# Altium footprint library Connectors SMD.PcbLib: 130 footprints (part 4 of 12) (continued)
## MOLEX_78171-0004 [mm] "1.20mm Pitch Pico-EZmate Wire-to-Board Header, Vertical, Housing Height: 1.55mm, with Side-Friction Locks, 4 Circuits"
height 1.55
pads (6):
  rect 0.6x0.85 smd: 1(-1.8,-0.01) 2(-0.6,-0.01) 3(0.6,-0.01) 4(1.8,-0.01)
  rect 0.7x0.8 smd: 5(2.89,-3.788) 6(-2.95,-3.788)
Top Overlay:
  circle w0.25: c-1.8,1.075 r0.125
  lines w0.2: -3.3,-2.99 -3.3,0.16 -2.5,0.16 ; -2.85,-2.99 -2.85,-2.69 -2.6,-2.69 -2.6,-2.19 -2.85,-2.19 -2.85,-1.67 -2.49,-1.67 -2.49,-1.24 -2.84,-1.24 -2.84,-0.64 -2.5,-0.64 ; -2.2,-4.34 -1.95,-4.34 -1.41,-3.66 1.41,-3.66 1.95,-4.34 2.14,-4.34 ; -2.1,-4.34 -2.1,-1.47 2.1,-1.47 2.1,-4.34 ; 2.5,-0.64 2.84,-0.64 2.84,-1.24 2.49,-1.24 2.49,-1.67 2.85,-1.67 2.85,-2.19 2.6,-2.19 2.6,-2.69 2.85,-2.69 2.85,-2.99 ; 2.5,0.16 3.3,0.16 3.3,-2.99
Mechanical 7:
  lines w0.1: -2.85,-1.67 -2.49,-1.67
Mechanical 8:
  lines w0.1: -0.5,0 0,0 ; 0,-0.5 0,0 ; 0,0.5 0,0 ; 0.5,0 0,0 ; -3.3,-4.185 -2.6,-4.185 ; -3.3,-4.185 -3.3,-3.39 -2.6,-3.39 -2.6,-4.185 ; -3.3,-4.185 -2.95,-3.788 -2.6,-4.185 ; -2.1,-0.435 -1.8,-0.01 -1.5,-0.435 ; -2.1,-0.435 -2.1,0.415 -1.5,0.415 -1.5,-0.435 ; -2.1,-0.435 -1.5,-0.435 ; -0.9,-0.435 -0.6,-0.01 -0.3,-0.435 ; -0.9,-0.435 -0.9,0.415 -0.3,0.415 -0.3,-0.435 ; -0.9,-0.435 -0.3,-0.435 ; 0.3,-0.435 0.6,-0.01 0.9,-0.435 ; 0.3,-0.435 0.3,0.415 0.9,0.415 0.9,-0.435 ; 0.3,-0.435 0.9,-0.435 ; 1.5,-0.435 1.8,-0.01 2.1,-0.435 ; 1.5,-0.435 1.5,0.415 2.1,0.415 2.1,-0.435 ; 1.5,-0.435 2.1,-0.435 ; 2.54,-4.185 3.24,-4.185 ; 2.54,-4.185 2.54,-3.39 3.24,-3.39 3.24,-4.185 ; 2.54,-4.185 2.89,-3.788 3.24,-4.185
Mechanical 14:
  lines w0.1: -3.3,-3.44 -2.6,-3.44 ; -3.3,-3.34 -2.5,-3.34 -2.6,-3.44 ; -3.07,-3.24 -3.07,-1.67 ; -2.89,-3.24 -2.89,-1.67 ; -2.85,-3.24 -2.85,-2.69 -2.6,-2.69 -2.6,-2.19 -2.85,-2.19 -2.85,-1.67 ; -2.69,-1.67 -2.69,-1.44 ; -2.6,-4.34 -2.6,-3.44 ; -2.5,-4.34 -2.5,-3.24 -3.1,-3.24 -3.1,-1.67 -2.49,-1.67 -2.49,-1.24 ; -2.1,-4.34 -2.1,-1.47 2.1,-1.47 2.1,-4.34 ; 2.5,-4.34 2.5,-3.24 3.1,-3.24 3.1,-1.67 2.49,-1.67 2.49,-1.24 ; 2.6,-4.34 2.6,-3.44 ; 2.69,-1.67 2.69,-1.44 ; 2.85,-3.24 2.85,-1.67 ; 2.85,-2.69 2.6,-2.69 2.6,-2.19 2.85,-2.19 ; 2.89,-3.24 2.89,-1.67 ; 3.3,-3.44 2.6,-3.44 ; 3.3,-3.34 2.5,-3.34 2.6,-3.44 ; -3.04,-1.44 -3.04,-0.44 ; -3.04,-1.44 -2.84,-1.24 ; -3.04,-1.44 -2.69,-1.44 ; -3.04,-0.44 -2.84,-0.64 ; -3.04,-0.44 3.04,-0.44 ; -2.84,-1.24 -2.49,-1.24 ; -2.84,-1.24 -2.84,-0.64 ; -2.84,-0.64 2.84,-0.64 ; -2.69,-1.44 -2.49,-1.24 ; 2.49,-1.24 2.69,-1.44 ; 2.49,-1.24 2.84,-1.24 ; 2.69,-1.44 3.04,-1.44 ; 2.84,-1.24 3.04,-1.44 ; 2.84,-1.24 2.84,-0.64 ; 2.84,-0.64 3.04,-0.44 ; 3.04,-1.44 3.04,-0.44 ; -3.3,-4.34 -3.3,0.16 3.3,0.16 3.3,-4.34 1.95,-4.34 1.41,-3.66 -1.41,-3.66 -1.95,-4.34 -3.3,-4.34 ; -3.02,-4.17 -2.82,-4.17 -2.82,-3.5 -3.02,-3.5 -3.02,-4.17 ; 2.82,-4.17 2.82,-3.5 3.02,-3.5 3.02,-4.17 2.82,-4.17
Mechanical 15:
  lines w0.05: -3.55,-4.59 3.55,-4.59 3.55,0.665 -3.55,0.665 -3.55,-4.59
3D body: height 1.45, standoff 0, extent -3.3,-4.34 3.3,0.19

## MOLEX_87703-0001 [mm] "1.27mm Pitch Serial ATA Device Plug, 63.50mm Drive, Without Jumper, 22 Circuits"
height 4
pads (26):
  rect 3.66x4.4 smd: 1(-24.15,-4.8) 2(24.15,-4.8)
  round 1 hole 1.3 unplated mask+0.15: MTG1(-18.865,0) MTG2(18.865,0)
  rect 0.9x2.1 smd: P1(1.905,0) P2(0.635,0) P3(-0.635,0) P4(-1.905,0) P5(-3.175,0) P6(-4.445,0) P7(-5.715,0) P8(-6.985,0) P9(-8.255,0) P10(-9.525,0) P11(-10.795,0) P12(-12.065,0) P13(-13.335,0) P14(-14.605,0) P15(-15.875,0) S1(15.875,0) S2(14.605,0) S3(13.335,0) S4(12.065,0) S5(10.795,0) S6(9.525,0) S7(8.255,0)
Top Overlay:
  drawing of 164 lines, arcs and shapes, not listed
  text "S1" at 15.325,1.57 h1
  text "P1" at 1.38,1.62 h1
Keep-Out Layer:
  board cut-out: -21.765,-7.55 -21.774,-2.6 -21.739,-2.339 -21.639,-2.096 -21.478,-1.887 -21.269,-1.727 -21.026,-1.626 -20.765,-1.591 -20.765,-1.6 20.765,-1.591 21.026,-1.626 21.269,-1.727 21.478,-1.887 21.639,-2.096 21.739,-2.339 21.774,-2.6 21.765,-2.6 21.765,-7.55
Mechanical 1:
  lines w0.635: -21.765,-7.55 -21.765,-2.6 cw(c-20.765,-2.6) -20.765,-1.6 0,-1.6 20.765,-1.6 cw(c20.765,-2.6) 21.765,-2.6 21.765,-7.55
Mechanical 8:
  drawing of 215 lines, arcs and shapes, not listed
Mechanical 13:
  lines w0.254: 2.875,-2.65 2.875,-2.09
Mechanical 14:
  drawing of 190 lines, arcs and shapes, not listed
  text "S1" at 15.325,1.57 h1
  text "P1" at 1.38,1.62 h1
Mechanical 15:
  lines w0.05: -26.23,-7.8 -26.23,1.3 26.23,1.3 26.23,-7.8 -26.23,-7.8
3D body: height 3.4, standoff -0.6, extent -25.465,-7.55 25.465,0.95

## MOLEX_87832-1420 [mm] "Milli-Grid, Pitch 2mm, 14 contacts, Surface Mount Vertical Header With Locking Window And Centre Polarization Slot"
height 6.4
pads (16):
  rect 1x2.75 smd: 1(-6,-2.125) 2(-6,2.125) 3(-4,-2.125) 4(-4,2.125) 5(-2,-2.125) 6(-2,2.125) 7(0,-2.125) 8(0,2.125) 9(2,-2.125) 10(2,2.125) 11(4,-2.125) 12(4,2.125) 13(6,-2.125) 14(6,2.125)
  round 0.5 hole 1 unplated: 15(-5,0) 16(5,0)
Top Overlay:
  lines w0.2: -8.325,-1.5 -7.675,-1.5 ; -8.325,0.5 -7.675,0.5 ; -6.8,-3.15 -8.325,-3.15 ; -6.8,-2.5 -7.675,-2.5 ; -6.8,2.5 -7.675,2.5 ; -6.8,3.15 -8.325,3.15 ; 6.8,-3.15 8.325,-3.15 ; 6.8,-2.5 7.675,-2.5 ; 6.8,2.5 7.675,2.5 ; 6.8,3.15 8.325,3.15 ; 7.675,-0.5 8.325,-0.5 ; 7.675,1.5 8.325,1.5 ; -8.325,-3.15 -7.675,-2.5 ; -8.325,-3.15 -8.325,3.15 ; -8.325,3.15 -7.675,2.5 ; -7.675,-2.5 -7.675,2.5 ; 7.675,-2.5 7.675,2.5 ; 7.675,-2.5 8.325,-3.15 ; 7.675,-2.5 8.325,-3.15 ; 7.675,2.5 8.325,3.15 ; 7.675,2.5 8.325,3.15 ; 8.325,-3.15 8.325,3.15 ; -6.5,-4.25 -5.5,-4.25 -6,-3.75 -6.5,-4.25
Mechanical 14:
  lines w0.1: -8.325,-1.5 -7.675,-1.5 ; -8.325,0.5 -7.675,0.5 ; 7.675,-0.5 8.325,-0.5 ; 7.675,1.5 8.325,1.5 ; -8.325,-3.15 -8.325,3.15 ; -8.325,-3.15 -7.675,-2.5 ; -8.325,-3.15 8.325,-3.15 ; -8.325,3.15 -7.675,2.5 ; -8.325,3.15 8.325,3.15 ; -7.675,-2.5 7.675,-2.5 ; -7.675,-2.5 -7.675,2.5 ; -7.675,2.5 7.675,2.5 ; 7.675,-2.5 8.325,-3.15 ; 7.675,-2.5 8.325,-3.15 ; 7.675,-2.5 7.675,2.5 ; 7.675,2.5 8.325,3.15 ; 7.675,2.5 8.325,3.15 ; 8.325,-3.15 8.325,3.15 ; -6.5,-4.25 -6,-3.75 -5.5,-4.25 -6.5,-4.25
Mechanical 15:
  lines w0.05: -8.575,-3.765 8.575,-3.765 8.575,3.765 -8.575,3.765 -8.575,-3.765
3D body: height 7.6, standoff -1, extent -8.325,-3.15 8.325,3.15

## MOLEX_91525-1210 [mm] "0.50mm (.020\") Pitch LaneLink I/O Latch Receptacle, 12 Lane, Cx4 Ethernet, 24 Circuits, 2 Screw Holes"
height 11
pads (77):
  rect 0.31x2.6 smd: G1(18,0) G2(16.5,0) G3(15,0) G4(13.5,0) G5(12,0) G6(10.5,0) G7(9,0) G8(7.5,0) G9(6,0) G10(4.5,0) G11(3,0) G12(1.5,0) G13(0,0) G14(-1.5,0) G15(-3,0) G16(-4.5,0) G17(-6,0) G18(-7.5,0) G19(-9,0) G20(-10.5,0) G21(-12,0) G22(-13.5,0) G23(-15,0) G24(-16.5,0) G25(-18,0) S1(17.5,-2.1) S2(17,-2.1) S3(16,-2.1) S4(15.5,-2.1) S5(14.5,-2.1) S6(14,-2.1) S7(13,-2.1) S8(12.5,-2.1) S9(11.5,-2.1) S10(11,-2.1) S11(10,-2.1) S12(9.5,-2.1) S13(8.5,-2.1) S14(8,-2.1) S15(7,-2.1) S16(6.5,-2.1) S17(5.5,-2.1) S18(5,-2.1) S19(4,-2.1) S20(3.5,-2.1) S21(2.5,-2.1) S22(2,-2.1) S23(1,-2.1) S24(0.5,-2.1) S25(-0.5,-2.1) S26(-1,-2.1) S27(-2,-2.1) S28(-2.5,-2.1) S29(-3.5,-2.1) S30(-4,-2.1) S31(-5,-2.1) S32(-5.5,-2.1) S33(-6.5,-2.1) S34(-7,-2.1) S35(-8,-2.1) S36(-8.5,-2.1) S37(-9.5,-2.1) S38(-10,-2.1) S39(-11,-2.1) S40(-11.5,-2.1) S41(-12.5,-2.1) S42(-13,-2.1) S43(-14,-2.1) S44(-14.5,-2.1) S45(-15.5,-2.1) S46(-16,-2.1) S47(-17,-2.1) S48(-17.5,-2.1)
  round 1 hole 1.82 unplated: MTG1(19.25,-4.1)
  oval 1.78x1 hole 1.82 slot 2.6 at 0 deg unplated: MTG2(-19.2,-4.1)
  round 3.65 hole 2.2: MTG3(22.5,-2.1) MTG4(-22.45,-2.1)
Top Overlay:
  circle w0.25: c18,2.3 r0.125
  lines w0.2: -24.245,-1 -24.245,0.9 -20.345,0.9 -20.345,-2.35 -19.245,-2.35 ; -23.395,-8.5 -23.395,-14.9 -22.195,-14.9 -22.195,-8.5 ; -23.395,-8.2 -23.395,-4.2 ; -20.56,-8.5 -20.56,-14.2 ccw(c-19.86,-14.2) -19.86,-14.9 19.87,-14.9 ccw(c19.87,-14.2) 20.57,-14.2 20.57,-8.5 ; 18.6,1.7 19.1,0 19.6,1.7 ; 19.255,-2.35 20.355,-2.35 20.355,0.9 24.255,0.9 24.255,-1 ; 22.205,-8.5 22.205,-14.9 23.405,-14.9 23.405,-8.5 ; 23.405,-8.2 23.405,-4.2 ; -24.495,-8.5 24.505,-8.5 24.505,-8.2 -24.495,-8.2 -24.495,-8.5
Mechanical 8:
  lines w0.1: -25,-8 25,-8
  text "PCB Edge" at -3.175,-7.525 h1.02
Mechanical 13:
  circle w0.1: c22.455,-2.1 r1.1
  circle w0.1: c-19.245,-4.1 r0.91
  circle w0.1: c-22.445,-2.1 r1.1
  lines w0.1: -23.545,-2.1 -22.445,-2.1 -22.445,-3.2 ; -19.245,-5.01 -19.245,-4.1 -18.335,-4.1 ; 17.955,-4.1 18.865,-4.1 18.865,-5.01 ; 19.255,-4.454 19.255,-4.1 19.554,-4.1 ; 20.555,-4.1 19.645,-4.1 19.645,-5.01 ; 22.455,-3.2 22.455,-2.1 23.555,-2.1 ; 18.865,-5.01 cw(c18.865,-4.1) 18.865,-3.19 19.645,-3.19 cw(c19.645,-4.1) 19.645,-5.01 ; 18.865,-5.01 19.645,-5.01
Mechanical 14:
  circle w0.25: c18,2.3 r0.125
  lines w0.1: -23.395,-8.5 -23.395,-14.9 -22.195,-14.9 -22.195,-8.5 ; -23.395,-8.2 -23.395,-3.71 -23.595,-3.51 -24.045,-3.51 -24.245,-3.31 -24.245,0.9 -20.345,0.9 -20.345,-2.35 -19.245,-2.35 ; -20.56,-8.5 -20.56,-14.2 ccw(c-19.86,-14.2) -19.86,-14.9 19.87,-14.9 ccw(c19.87,-14.2) 20.57,-14.2 20.57,-8.5 ; 19.255,-2.35 20.355,-2.35 20.355,0.9 24.255,0.9 24.255,-3.31 24.055,-3.51 23.605,-3.51 23.405,-3.71 23.405,-8.2 ; 22.205,-8.5 22.205,-14.9 23.405,-14.9 23.405,-8.5 ; -24.495,-8.5 24.505,-8.5 24.505,-8.2 -24.495,-8.2 -24.495,-8.5
  lines w0.2: 18.6,1.7 19.1,0 19.6,1.7
Mechanical 15:
  lines w0.05: -0.5,0 0.5,0 ; 0,-0.5 0,0.5 ; -25,-8 -25,1.7 25,1.7 25,-8 -25,-8
3D body: height 11.05, standoff -2.35, extent -24.458,-14.898 24.542,1.002

## MOLEX_500254-1927 [mm] "19 Contacts, Pitch 0.5mm, Right Angle, HDMI Receptacle"
height 6.18
pads (23):
  rect 0.28x2.6 smd: 1(4.5,0) 2(4,0) 3(3.5,0) 4(3,0) 5(2.5,0) 6(2,0) 7(1.5,0) 8(1,0) 9(0.5,0) 10(0,0) 11(-0.5,0) 12(-1,0) 13(-1.5,0) 14(-2,0) 15(-2.5,0) 16(-3,0) 17(-3.5,0) 18(-4,0) 19(-4.5,0)
  oval 1.5x2.7 hole 0.9 slot 2.1 at 90 deg: SHIELD(-7.25,-6.72) SHIELD(7.25,-6.72)
  oval 1.5x3.3 hole 0.9 slot 2.7 at 90 deg: SHIELD(-7.25,-0.76) SHIELD(7.25,-0.76)
Top Overlay:
  circle w0.25: c5.225,1.075 r0.125
  lines w0.2: -7.5,-8.34 -7.5,-11.31 7.5,-11.31 7.5,-8.34 ; -7.5,-5.1 -7.5,-2.68 ; -6.5,-11.31 -6.5,-8.055 ; -6.5,-5.385 -6.5,-2.395 ; -6.467,0.84 -5.8,0.84 -5.8,-1.66 ; -6.388,0.74 -5.8,0.74 ; -6.2,-1.66 -5.8,-1.66 ; -6.2,-0.16 -5.8,-0.16 ; -5.8,-0.26 -4.94,-0.26 ; -5.6,-0.26 -5.6,-0.71 -4.94,-0.71 ; -4.94,-0.76 -5.6,-0.76 -5.6,-1.46 cw(c-5.8,-1.46) -5.8,-1.66 ; 4.94,-0.76 5.6,-0.76 5.6,-1.46 ccw(c5.8,-1.46) 5.8,-1.66 ; 4.94,-0.71 5.6,-0.71 5.6,-0.26 ; 4.94,-0.26 5.8,-0.26 ; 5.8,-0.16 6.2,-0.16 ; 5.8,0.74 6.388,0.74 ; 5.8,1.09 6.467,1.09 ; 6.2,-1.66 5.8,-1.66 ; 6.467,0.84 5.8,0.84 5.8,-1.66 ; 6.5,-11.31 6.5,-8.055 ; 6.5,-5.385 6.5,-2.395 ; 7.5,-5.1 7.5,-2.68
Mechanical 8:
  lines w0.1: -8,-10.31 0,-10.31 8,-10.31 ; -7.75,-7.32 -7.25,-7.32 ; -7.75,-6.72 -7.25,-6.72 ; -7.75,-6.12 -7.25,-6.12 ; -7.75,-1.66 -7.25,-1.66 ; -7.75,-0.76 -7.25,-0.76 ; -7.75,0.14 -7.25,0.14 ; -7.25,-7.82 -7.25,-7.32 ; -7.25,-7.22 -7.25,-6.72 ; -7.25,-6.22 -7.25,-6.72 ; -7.25,-5.62 -7.25,-6.12 ; -7.25,-2.16 -7.25,-1.66 ; -7.25,-1.26 -7.25,-0.76 ; -7.25,-0.26 -7.25,-0.76 ; -7.25,0.64 -7.25,0.14 ; -6.75,-7.32 -7.25,-7.32 ; -6.75,-6.72 -7.25,-6.72 ; -6.75,-6.12 -7.25,-6.12 ; -6.75,-1.66 -7.25,-1.66 ; -6.75,-0.76 -7.25,-0.76 ; -6.75,0.14 -7.25,0.14 ; -5,0 -4.5,0 ; -4.5,-0.5 -4.5,0 ; -4.5,0.5 -4.5,0 ; -4,-0.5 -4,0 -4,0.5 ; -3.5,-0.5 -3.5,0 -3.5,0.5 ; -3,-0.5 -3,0 -3,0.5 ; -2.5,-0.5 -2.5,0 -2.5,0.5 ; -2,-0.5 -2,0 -2,0.5 ; -1.5,-0.5 -1.5,0 -1.5,0.5 ; -1,-0.5 -1,0 -1,0.5 ; -0.5,-0.5 -0.5,0 -0.5,0.5 ; -0.354,-0.354 0,0 ; -0.354,0.354 0,0 ; 0,-0.5 0,0 ; 0,0.5 0,0 ; 0.354,-0.354 0,0 ; 0.354,0.354 0,0 ; 0.5,-0.5 0.5,0 0.5,0.5 ; 1,-0.5 1,0 1,0.5 ; 1.5,-0.5 1.5,0 1.5,0.5 ; 2,-0.5 2,0 2,0.5 ; 2.5,-0.5 2.5,0 2.5,0.5 ; 3,-0.5 3,0 3,0.5 ; 3.5,-0.5 3.5,0 3.5,0.5 ; 4,-0.5 4,0 4,0.5 ; 4.5,-0.5 4.5,0 ; 4.5,0.5 4.5,0 ; 5,0 4.5,0 ; 6.75,-7.32 7.25,-7.32 ; 6.75,-6.72 7.25,-6.72 ; 6.75,-6.12 7.25,-6.12 ; 6.75,-1.66 7.25,-1.66 ; 6.75,-0.76 7.25,-0.76 ; 6.75,0.14 7.25,0.14 ; 7.25,-7.82 7.25,-7.32 ; 7.25,-7.22 7.25,-6.72 ; 7.25,-6.22 7.25,-6.72 ; 7.25,-5.62 7.25,-6.12 ; 7.25,-2.16 7.25,-1.66 ; 7.25,-1.26 7.25,-0.76 ; 7.25,-0.26 7.25,-0.76 ; 7.25,0.64 7.25,0.14 ; 7.75,-7.32 7.25,-7.32 ; 7.75,-6.72 7.25,-6.72 ; 7.75,-6.12 7.25,-6.12 ; 7.75,-1.66 7.25,-1.66 ; 7.75,-0.76 7.25,-0.76 ; 7.75,0.14 7.25,0.14 ; -4.5,0 4.5,0 ; 4.64,-1.3 4.64,1.3 ; 4.64,-1.3 4.64,1.3 ; 4.64,-1.3 4.64,1.3 ; 4.64,-1.3 4.64,1.3 ; 4.64,-1.3 4.64,1.3 ; 4.64,-1.3 4.64,1.3 ; 4.64,-1.3 4.64,1.3 ; 4.64,-1.3 4.64,1.3 ; 4.64,-1.3 4.64,1.3 ; 4.64,-1.3 4.64,1.3 ; 4.64,-1.3 4.36,-1.3 4.36,1.3 4.64,1.3 ; 4.64,-1.3 4.64,1.3 ; -8,-7.32 ccw(c-7.25,-7.32) -6.5,-7.32 -6.5,-6.12 ccw(c-7.25,-6.12) -8,-6.12 -8,-7.32 ; -8,-1.66 ccw(c-7.25,-1.66) -6.5,-1.66 -6.5,0.14 ccw(c-7.25,0.14) -8,0.14 -8,-1.66 ; -7.7,-7.32 ccw(c-7.25,-7.32) -6.8,-7.32 -6.8,-6.12 ccw(c-7.25,-6.12) -7.7,-6.12 -7.7,-7.32 ; -7.7,-1.66 ccw(c-7.25,-1.66) -6.8,-1.66 -6.8,0.14 ccw(c-7.25,0.14) -7.7,0.14 -7.7,-1.66 ; -4.64,-1.3 -4.64,1.3 -4.36,1.3 -4.36,-1.3 -4.64,-1.3 ; 6.5,-7.32 ccw(c7.25,-7.32) 8,-7.32 8,-6.12 ccw(c7.25,-6.12) 6.5,-6.12 6.5,-7.32 ; 6.5,-1.66 ccw(c7.25,-1.66) 8,-1.66 8,0.14 ccw(c7.25,0.14) 6.5,0.14 6.5,-1.66 ; 6.8,-7.32 ccw(c7.25,-7.32) 7.7,-7.32 7.7,-6.12 ccw(c7.25,-6.12) 6.8,-6.12 6.8,-7.32 ; 6.8,-1.66 ccw(c7.25,-1.66) 7.7,-1.66 7.7,0.14 ccw(c7.25,0.14) 6.8,0.14 6.8,-1.66
Mechanical 14:
  lines w0.1: -7.5,-1.66 -5.8,-1.66 ; -7.5,-1.06 -7,-1.06 ; -7.5,-0.66 cw(c-7.15,-0.66) -7.15,-0.31 -7,-0.31 ; -7,-1.66 -7,0.24 -7.5,0.24 -7.5,-11.31 7.5,-11.31 7.5,0.24 7,0.24 7,-1.66 ; -7,-0.16 -5.8,-0.16 ; -6.95,-0.16 -6.95,0.84 ; -6.85,-0.16 -6.85,0.74 ; -6.5,-11.31 -6.5,-1.66 ; -5.8,-0.26 5.8,-0.26 ; -5.8,0.74 -6.85,0.74 ; -5.6,-0.26 -5.6,-0.71 -4.9,-0.71 ; -4.9,-0.26 -4.9,-0.76 -5.6,-0.76 -5.6,-1.46 cw(c-5.8,-1.46) -5.8,-1.66 ; -3.2,-0.71 -1.2,-0.71 ; -3.2,-0.26 -3.2,-1.06 ccw(c-3,-1.06) -3,-1.26 -1.4,-1.26 ccw(c-1.4,-1.06) -1.2,-1.06 -1.2,-0.26 ; 1.2,-0.71 3.2,-0.71 ; 1.2,-0.26 1.2,-1.06 ccw(c1.4,-1.06) 1.4,-1.26 3,-1.26 ccw(c3,-1.06) 3.2,-1.06 3.2,-0.26 ; 4.9,-0.71 5.6,-0.71 5.6,-0.26 ; 4.9,-0.26 4.9,-0.76 5.6,-0.76 5.6,-1.46 ccw(c5.8,-1.46) 5.8,-1.66 ; 5.8,-0.16 7,-0.16 ; 5.8,0.74 6.85,0.74 ; 6.5,-11.31 6.5,-1.66 ; 6.85,-0.16 6.85,0.74 ; 6.95,-0.16 6.95,0.84 ; 7,-1.06 7.5,-1.06 ; 7,-0.31 7.15,-0.31 cw(c7.15,-0.66) 7.5,-0.66 ; 7.5,-1.66 5.8,-1.66 ; -6.95,0.84 -6.85,0.74 ; -6.95,0.84 -5.8,0.84 -5.8,-1.66 ; 5.8,-1.66 5.8,0.84 6.95,0.84 ; 6.85,0.74 6.95,0.84
Mechanical 15:
  lines w0.1: 7.5,-11.56 -7.75,-11.56 -7.75,-8.186 cw(c-7.25,-7.32) -8.25,-7.32 -8.25,-6.12 cw(c-7.25,-6.12) -7.75,-5.254 -7.75,-2.526 cw(c-7.25,-1.66) -8.25,-1.66 -8.25,0.14 cw(c-7.25,0.14) -6.938,1.09 -5.55,1.09 -5.55,-0.01 -4.89,-0.01 -4.89,1.55 4.89,1.55 4.89,-0.01 5.55,-0.01 5.55,1.09 6.938,1.09 cw(c7.25,0.14) 8.25,0.14 8.25,-1.66 cw(c7.25,-1.66) 7.75,-2.526 7.75,-5.254 cw(c7.25,-6.12) 8.25,-6.12 8.25,-7.32 cw(c7.25,-7.32) 7.75,-8.186 7.75,-11.56
3D body: height 6.18, standoff -2.2, extent -7.5,-11.31 7.5,0.84

## MULTICOMP_64L020S-3x1N-B [mm] "0.4mm Pitch, Mini DisplayPort Receptacle, 20 Positions, Right Angled"
height 8.2
pads (24):
  rect 0.45x1.4 smd: 1(2.7,6.67) 3(2.1,6.67) 5(1.5,6.67) 7(0.9,6.67) 9(0.3,6.67) 11(-0.3,6.67) 13(-0.9,6.67) 15(-1.5,6.67) 17(-2.1,6.67) 19(-2.7,6.67)
  round 0.9 hole 0.5: 2(2.7,3.5) 4(2.7,4.71) 6(1.52,4.71) 8(1.6,3.5) 10(0.53,3.5) 12(-0.53,3.5) 14(-1.6,3.5) 16(-1.52,4.71) 18(-2.7,4.71)
  round 1.1 hole 0.6: 20(-2.8,3.5)
  round 1 hole 1.5 unplated mask+0.25: P1(-2.4,0) P2(2.4,0)
  oval 1.5x2.9 hole 0.8 slot 2.1 at 90 deg: SHIELD(-4.35,1.93) SHIELD(4.35,1.93)
Top Overlay:
  circle w0.25: c3.5,7.5 r0.125
  lines w0.2: -4.557,0 -4.557,-1.11 -4.15,-1.11 ; -4.557,3.81 -4.557,6.552 -3.425,6.552 ; -4.557,5.63 -4.536,5.63 ; -4.29,-1.11 -4.29,0 ; -4.15,0 -4.15,-7.4 4.15,-7.4 4.15,0 ; -4.15,3.81 -4.15,5.63 -3.425,5.63 ; -4.15,4.252 -4.536,4.252 -4.536,5.752 cw(c-3.736,5.752) -3.736,6.552 ; -4.129,5.63 -4.129,5.752 cw(c-3.729,5.752) -3.729,6.152 -3.425,6.152 ; -3.4,-7.4 -3.4,-0.75 ; -0.946,-6.234 -1.113,-3.392 ccw(c-1.5,-3.446) -1.888,-3.394 -2.058,-6.234 cw(c-2.267,-6.151) -2.492,-6.137 -2.293,-2.984 cw(c-1.794,-3.016) -1.794,-2.516 -1.206,-2.516 cw(c-1.206,-3.016) -0.707,-2.984 -0.508,-6.137 cw(c-0.733,-6.151) -0.942,-6.234 ; 0.942,-6.234 cw(c0.733,-6.151) 0.508,-6.137 0.707,-2.984 cw(c1.206,-3.016) 1.206,-2.516 1.794,-2.516 cw(c1.794,-3.016) 2.293,-2.984 2.492,-6.137 cw(c2.267,-6.151) 2.058,-6.234 1.888,-3.394 ccw(c1.5,-3.446) 1.113,-3.392 0.946,-6.234 ; 3.4,-7.4 3.4,-0.75 ; 3.425,5.63 4.15,5.63 4.15,3.81 ; 3.425,6.152 3.729,6.152 cw(c3.729,5.752) 4.129,5.752 4.129,5.63 ; 3.425,6.552 4.557,6.552 4.557,3.81 ; 3.736,6.552 cw(c3.736,5.752) 4.536,5.752 4.536,4.252 4.15,4.252 ; 4.15,-1.11 4.557,-1.11 4.557,0 ; 4.536,5.63 4.557,5.63
Mechanical 8:
  drawing of 167 lines, arcs and shapes, not listed
  text "8" at 1.513,2.486 h0.25
  text "20" at -2.972,2.486 h0.25
  text "16" at -0.762,4.572 h0.25
  text "14" at -1.763,2.486 h0.25
  text "12" at -0.688,2.486 h0.25
  text "10" at 0.38,2.486 h0.25
  text "6" at 0.635,4.572 h0.25
  text "2" at 2.608,2.486 h0.25
  text "4" at 3.4,4.572 h0.25
  text "18" at -3.81,4.572 h0.25
  text "19" at -2.859,5.581 h0.25
  text "17" at -2.25,5.581 h0.25
  text "15" at -1.655,5.581 h0.25
  text "13" at -1.055,5.581 h0.25
  text "11" at -0.425,5.581 h0.25
  text "9" at 0.208,5.581 h0.25
  text "7" at 0.813,5.581 h0.25
  text "5" at 1.407,5.581 h0.25
  text "3" at 2.007,5.581 h0.25
  text "1" at 2.638,5.581 h0.25
Mechanical 14:
  circle w0.25: c3.5,7.5 r0.125
  lines w0.1: -4.557,5.63 -4.536,5.63 ; -4.536,4.252 -4.15,4.252 ; -4.29,-1.11 -4.29,3.452 ; -4.15,-1.11 -4.557,-1.11 -4.557,6.552 4.557,6.552 4.557,-1.11 4.15,-1.11 ; -4.15,3.452 -4.536,3.452 -4.536,5.752 cw(c-3.736,5.752) -3.736,6.552 ; -4.129,5.63 -4.129,5.752 cw(c-3.729,5.752) -3.729,6.152 -3.4,6.152 ; -3.4,-7.4 -3.4,6.552 ; -3.4,5.63 -4.15,5.63 -4.15,-7.4 4.15,-7.4 4.15,5.63 3.4,5.63 ; -2.8,6.552 -2.8,6.96 -2.6,6.96 -2.6,6.552 ; -2.2,6.552 -2.2,6.96 -2,6.96 -2,6.552 ; -1.6,6.552 -1.6,6.96 -1.4,6.96 -1.4,6.552 ; -1,6.552 -1,6.96 -0.8,6.96 -0.8,6.552 ; -0.946,-6.234 -1.113,-3.392 ccw(c-1.5,-3.446) -1.888,-3.394 -2.058,-6.234 cw(c-2.267,-6.151) -2.492,-6.137 -2.293,-2.984 cw(c-1.794,-3.016) -1.794,-2.516 -1.206,-2.516 cw(c-1.206,-3.016) -0.707,-2.984 -0.508,-6.137 cw(c-0.733,-6.151) -0.942,-6.234 ; -0.4,6.552 -0.4,6.96 -0.2,6.96 -0.2,6.552 ; 0.2,6.552 0.2,6.96 0.4,6.96 0.4,6.552 ; 0.8,6.552 0.8,6.96 1,6.96 1,6.552 ; 0.942,-6.234 cw(c0.733,-6.151) 0.508,-6.137 0.707,-2.984 cw(c1.206,-3.016) 1.206,-2.516 1.794,-2.516 cw(c1.794,-3.016) 2.293,-2.984 2.492,-6.137 cw(c2.267,-6.151) 2.058,-6.234 1.888,-3.394 ccw(c1.5,-3.446) 1.113,-3.392 0.946,-6.234 ; 1.4,6.552 1.4,6.96 1.6,6.96 1.6,6.552 ; 2,6.552 2,6.96 2.2,6.96 2.2,6.552 ; 2.6,6.552 2.6,6.96 2.8,6.96 2.8,6.552 ; 3.4,-7.4 3.4,6.552 ; 3.4,6.152 3.729,6.152 cw(c3.729,5.752) 4.129,5.752 4.129,5.63 ; 3.736,6.552 cw(c3.736,5.752) 4.536,5.752 4.536,3.452 4.15,3.452 ; 4.15,4.252 4.536,4.252 ; 4.29,-1.11 4.29,3.452 ; 4.536,5.63 4.557,5.63
Mechanical 15:
  lines w0.05: -4.807,-7.65 -4.807,7.21 4.807,7.21 4.807,-7.65 -4.807,-7.65
3D body: height 8.38, standoff -2.3, extent -4.55,-7.4 4.557,7.16

## NICOMATIC_C12000B [mm] "Surface Mount PCB Test Point"
height 1.5
pads (2):
  rect 1.5x1.5 smd: 1(-1,0) 1(1,0)
Top Overlay:
  lines w0.2: 0,-0.675 0,0.675
Mechanical 8:
  lines w0.1: -0.6,0 0,0 ; 0,-0.6 0,0 ; 0,0.6 0,0 ; 0.6,0 0,0
Mechanical 14:
  lines w0.1: -1.25,-0.675 -0.35,-0.675 -0.35,-0.475 0.35,-0.475 0.35,-0.675 1.25,-0.675 1.25,0.675 0.35,0.675 0.35,0.475 -0.35,0.475 -0.35,0.675 -1.25,0.675 -1.25,-0.675
3D body: height 1.5, standoff 0, extent -1.25,-0.675 1.25,0.675

## PANASONIC_AXK5SA3277YG [mm] "130 Contacts, Narrow-Pitch 0.5mm, Surface Mount, Straight Board Stacking Socket, AXK5S Serie"
height 3.55
pads (132):
  rect 0.5x2 smd: 1(16.125,2.2) 2(16.125,-2.2) 129(-16.125,2.2) 130(-16.125,-2.2)
  rect 0.25x2 smd: 3(15.5,2.2) 4(15.5,-2.2) 5(15,2.2) 6(15,-2.2) 7(14.5,2.2) 8(14.5,-2.2) 9(14,2.2) 10(14,-2.2) 11(13.5,2.2) 12(13.5,-2.2) 13(13,2.2) 14(13,-2.2) 15(12.5,2.2) 16(12.5,-2.2) 17(12,2.2) 18(12,-2.2) 19(11.5,2.2) 20(11.5,-2.2) 21(11,2.2) 22(11,-2.2) 23(10.5,2.2) 24(10.5,-2.2) 25(10,2.2) 26(10,-2.2) 27(9.5,2.2) 28(9.5,-2.2) 29(9,2.2) 30(9,-2.2) 31(8.5,2.2) 32(8.5,-2.2) 33(8,2.2) 34(8,-2.2) 35(7.5,2.2) 36(7.5,-2.2) 37(7,2.2) 38(7,-2.2) 39(6.5,2.2) 40(6.5,-2.2) 41(6,2.2) 42(6,-2.2) 43(5.5,2.2) 44(5.5,-2.2) 45(5,2.2) 46(5,-2.2) 47(4.5,2.2) 48(4.5,-2.2) 49(4,2.2) 50(4,-2.2) 51(3.5,2.2) 52(3.5,-2.2) 53(3,2.2) 54(3,-2.2) 55(2.5,2.2) 56(2.5,-2.2) 57(2,2.2) 58(2,-2.2) 59(1.5,2.2) 60(1.5,-2.2) 61(1,2.2) 62(1,-2.2) 63(0.5,2.2) 64(0.5,-2.2) 65(0,2.2) 66(0,-2.2) 67(-0.5,2.2) 68(-0.5,-2.2) 69(-1,2.2) 70(-1,-2.2) 71(-1.5,2.2) 72(-1.5,-2.2) 73(-2,2.2) 74(-2,-2.2) 75(-2.5,2.2) 76(-2.5,-2.2) 77(-3,2.2) 78(-3,-2.2) 79(-3.5,2.2) 80(-3.5,-2.2) 81(-4,2.2) 82(-4,-2.2) 83(-4.5,2.2) 84(-4.5,-2.2) 85(-5,2.2) 86(-5,-2.2) 87(-5.5,2.2) 88(-5.5,-2.2) 89(-6,2.2) 90(-6,-2.2) 91(-6.5,2.2) 92(-6.5,-2.2) 93(-7,2.2) 94(-7,-2.2) 95(-7.5,2.2) 96(-7.5,-2.2) 97(-8,2.2) 98(-8,-2.2) 99(-8.5,2.2) 100(-8.5,-2.2) 101(-9,2.2) 102(-9,-2.2) 103(-9.5,2.2) 104(-9.5,-2.2) 105(-10,2.2) 106(-10,-2.2) 107(-10.5,2.2) 108(-10.5,-2.2) 109(-11,2.2) 110(-11,-2.2) 111(-11.5,2.2) 112(-11.5,-2.2) 113(-12,2.2) 114(-12,-2.2) 115(-12.5,2.2) 116(-12.5,-2.2) 117(-13,2.2) 118(-13,-2.2) 119(-13.5,2.2) 120(-13.5,-2.2) 121(-14,2.2) 122(-14,-2.2) 123(-14.5,2.2) 124(-14.5,-2.2) 125(-15,2.2) 126(-15,-2.2) 127(-15.5,2.2) 128(-15.5,-2.2)
  round 0.5 hole 0.65 unplated mask+0.075: 131(-17.25,1.5) 132(17.25,-1.5)
Top Overlay:
  circle w0.25: c17.05,2.925 r0.125
  circle w0.2: c17.05,2.925 r0.2
  lines w0.2: -17.5,0.927 -17.5,0.6 -17.4,0.6 -17.4,-0.6 -17.5,-0.6 -17.5,-2.3 -16.675,-2.3 ; -17.5,2.073 -17.5,2.3 -16.675,2.3 ; -17.015,0.921 -17.015,-1.28 ; -16.801,1.066 -16.755,1.02 ; -16.675,-1.28 -17.015,-1.28 ; -16.675,-1.02 -16.755,-1.02 ; -16.675,1.02 -16.755,1.02 ; 16.675,-2.3 17.5,-2.3 17.5,-2.073 ; 16.675,-1.02 16.755,-1.02 ; 16.675,1.02 16.755,1.02 ; 16.675,1.28 17.015,1.28 ; 16.675,2.3 17.5,2.3 17.5,0.6 17.4,0.6 17.4,-0.6 17.5,-0.6 17.5,-0.927 ; 16.801,-1.066 16.755,-1.02 ; 17.015,-0.921 17.015,1.28 ; -17.015,-1.28 -16.755,-1.02 ; -16.755,-1.02 -16.755,1.02 ; 16.755,-1.02 16.755,1.02 ; 16.755,1.02 17.015,1.28
Mechanical 8:
  drawing of 792 lines, arcs and shapes, not listed
Mechanical 14:
  drawing of 428 lines, arcs and shapes, not listed
Mechanical 15:
  lines w0.05: -17.75,-3.45 17.75,-3.45 17.75,3.45 -17.75,3.45 -17.75,-3.45
3D body: height 3.55, standoff -0.45, extent -17.5,-2.7 17.5,2.7